# Altium footprint library SMD Component.PcbLib: 163 footprints (part 3 of 11)
Each footprint in its own frame and in the unit in brackets; x right, y up, seen from the top. Pads: shape width x height; smd on the part's side, far side on the other; paste and mask are expansions set on the pad; w line width, h text height; cw(c..) or ccw(c..) is an arc to the next point about the centre after c.
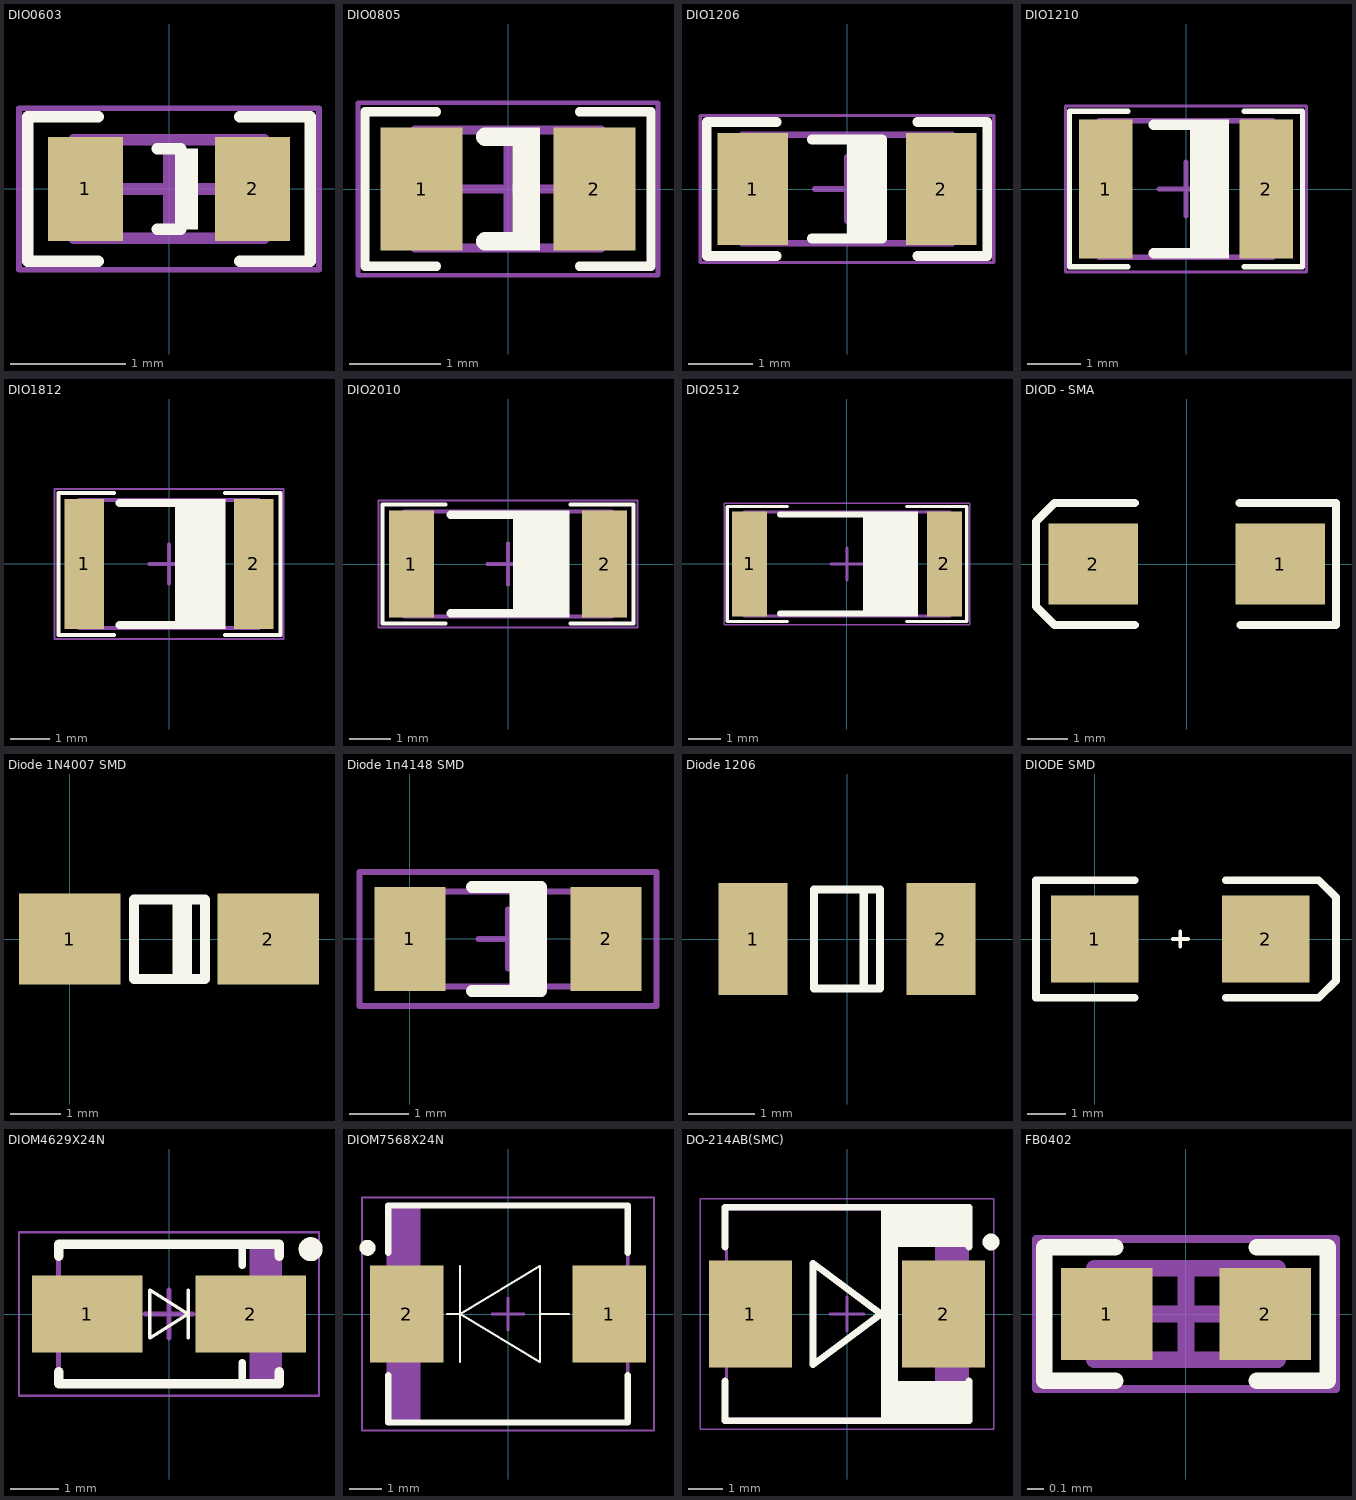
[diagram p2: the footprints below, top view; thin cyan lines are the x and y axes]

## DIO0603 [mm] "Chip Diode, 2-Leads, Body 1/60x0/80mm, IPC Medium Density DESIGNER:ABBAS BASEREH"
height 0.4
pads (2):
  rect 0.65x0.9 smd: 1(-0.725,0) 2(0.725,0)
Top Overlay:
  rectangle: 0.05,-0.35 0.25,0.35
  lines w0.1: -0.612,-0.625 -1.225,-0.625 -1.225,0.625 -0.612,0.625 ; -0.1,-0.35 0.1,-0.35 ; -0.1,0.35 0.1,0.35 ; 0.612,-0.625 1.225,-0.625 1.225,0.625 0.612,0.625
Mechanical 13:
  lines w0.1: -0.825,-0.425 -0.825,0.425 0.825,0.425 0.825,-0.425 -0.825,-0.425
Mechanical 15:
  lines w0.05: -1.3,-0.7 -1.3,0.7 1.3,0.7 1.3,-0.7 -1.3,-0.7
  lines w0.1: -0.425,0 0.425,0 ; 0,-0.425 0,0.425
3D body "DIO0603.step": height 0.4, standoff 0, extent -0.825,-0.425 0.825,0.425

## DIO0805 [mm] "Chip Diode, 2-Leads, Body 2/00x1/25mm, IPC Medium Density DESIGNER:ABBAS BASEREH"
height 0.5
pads (2):
  rect 0.9x1.35 smd: 1(-0.95,0) 2(0.95,0)
Top Overlay:
  rectangle: 0.05,-0.675 0.35,0.675
  lines w0.1: -0.788,-0.85 -1.575,-0.85 -1.575,0.85 -0.788,0.85 ; 0.788,-0.85 1.575,-0.85 1.575,0.85 0.788,0.85
  lines w0.2: -0.25,-0.575 0.1,-0.575 ; -0.25,0.575 0.1,0.575
Mechanical 13:
  lines w0.1: -1.025,-0.65 -1.025,0.65 1.025,0.65 1.025,-0.65 -1.025,-0.65
Mechanical 15:
  lines w0.05: -1.65,-0.95 -1.65,0.95 1.65,0.95 1.65,-0.95 -1.65,-0.95
  lines w0.1: -0.5,0 0.5,0 ; 0,-0.5 0,0.5
3D body "DIO0805.step": height 0.5, standoff 0, extent -1.025,-0.65 1.025,0.65

## DIO1206 [mm] "Chip Diode, 2-Leads, Body 3/20x1/60mm, IPC Medium Density DESIGNER:ABBAS BASEREH"
height 0.94
pads (2):
  rect 1.1x1.75 smd: 1(-1.475,0) 2(1.475,0)
Top Overlay:
  rectangle: 0,-0.8 0.625,0.775
  lines w0.15: -1.1,-1.05 -2.2,-1.05 -2.2,1.05 -1.1,1.05 ; -0.55,-0.775 0.55,-0.775 ; -0.55,0.775 0.55,0.775 ; 1.1,-1.05 2.2,-1.05 2.2,1.05 1.1,1.05
Mechanical 13:
  lines w0.1: -1.65,-0.85 1.65,-0.85 1.65,0.85 -1.65,0.85 -1.65,-0.85
Mechanical 15:
  lines w0.05: -2.3,-1.15 2.3,-1.15 2.3,1.15 -2.3,1.15 -2.3,-1.15
  lines w0.1: -0.5,0 0.5,0 ; 0,-0.5 0,0.5
3D body "DIO1206.step": height 0.94, standoff 0, extent -1.65,-0.85 1.65,0.85

## DIO1210 [mm] "Chip Diode, 2-Leads, Body 3/20x2/50mm, IPC Medium Density DESIGNER:ABBAS BASEREH"
height 0.55
pads (2):
  rect 1x2.6 smd: 1(-1.5,0) 2(1.5,0)
Top Overlay:
  rectangle: 0.075,-1.3 0.8,1.3
  lines w0.1: -1.088,-1.45 -2.175,-1.45 -2.175,1.45 -1.088,1.45 ; 1.088,-1.45 2.175,-1.45 2.175,1.45 1.088,1.45
  lines w0.2: -0.6,-1.2 0.6,-1.2 ; -0.6,1.2 0.6,1.2
Mechanical 13:
  lines w0.1: -1.625,-1.275 1.625,-1.275 1.625,1.275 -1.625,1.275 -1.625,-1.275
Mechanical 15:
  lines w0.05: -2.25,-1.55 2.25,-1.55 2.25,1.55 -2.25,1.55 -2.25,-1.55
  lines w0.1: -0.5,0 0.5,0 ; 0,-0.5 0,0.5
3D body "DIO1210.step": height 0.55, standoff 0, extent -1.625,-1.275 1.625,1.275

## DIO1812 [mm] "Chip Diode, 2-Leads, Body 4/50x3/20mm, IPC Medium Density DESIGNER:ABBAS BASEREH"
height 0.55
pads (2):
  rect 1x3.3 smd: 1(-2.15,0) 2(2.15,0)
Top Overlay:
  rectangle: 0.15,-1.65 1.425,1.65
  lines w0.1: -1.394,-1.8 -2.8,-1.8 -2.8,1.8 -1.394,1.8 ; 1.419,-1.8 2.825,-1.8 2.825,1.8 1.419,1.8
  lines w0.2: -1.25,-1.55 1.25,-1.55 ; -1.25,1.55 1.25,1.55
Mechanical 13:
  lines w0.1: -2.275,-1.625 -2.275,1.625 2.275,1.625 2.275,-1.625 -2.275,-1.625
Mechanical 15:
  lines w0.05: -2.9,-1.9 -2.9,1.9 2.9,1.9 2.9,-1.9 -2.9,-1.9
  lines w0.1: -0.5,0 0.5,0 ; 0,-0.5 0,0.5
3D body "DIO1812.step": height 0.55, standoff 0, extent -2.275,-1.625 2.275,1.625

## DIO2010 [mm] "Chip Diode, 2-Leads, Body 5/00x2/50mm, IPC Medium Density DESIGNER:ABBAS BASEREH"
height 0.55
pads (2):
  rect 1.1x2.6 smd: 1(-2.35,0) 2(2.35,0)
Top Overlay:
  rectangle: 0.125,-1.3 1.5,1.3
  lines w0.1: -1.525,-1.45 -3.05,-1.45 -3.05,1.45 -1.525,1.45 ; 1.525,-1.45 3.05,-1.45 3.05,1.45 1.525,1.45
  lines w0.2: -1.4,-1.2 1.4,-1.2 ; -1.4,1.2 1.4,1.2
Mechanical 13:
  lines w0.1: -2.525,-1.275 2.525,-1.275 2.525,1.275 -2.525,1.275 -2.525,-1.275
Mechanical 15:
  lines w0.05: -3.15,-1.55 3.15,-1.55 3.15,1.55 -3.15,1.55 -3.15,-1.55
  lines w0.1: -0.5,0 0.5,0 ; 0,-0.5 0,0.5
3D body "DIO2010.step": height 0.55, standoff 0, extent -2.525,-1.275 2.525,1.275

## DIO2512 [mm] "Chip Diode, 2-Leads, Body 6/40x3/20mm, IPC Medium Density DESIGNER:ABBAS BASEREH"
height 0.7
pads (2):
  rect 1.1x3.3 smd: 1(-3.05,0) 2(3.05,0)
Top Overlay:
  rectangle: 0.5,-1.65 2.225,1.65
  lines w0.1: -1.875,-1.8 -3.75,-1.8 -3.75,1.8 -1.875,1.8 ; 1.875,-1.8 3.75,-1.8 3.75,1.8 1.875,1.8
  lines w0.2: -2.1,-1.55 2.1,-1.55 ; -2.1,1.55 2.1,1.55
Mechanical 13:
  lines w0.1: -3.225,-1.625 3.225,-1.625 3.225,1.625 -3.225,1.625 -3.225,-1.625
Mechanical 15:
  lines w0.05: -3.85,-1.9 3.85,-1.9 3.85,1.9 -3.85,1.9 -3.85,-1.9
  lines w0.1: -0.5,0 0.5,0 ; 0,-0.5 0,0.5
3D body "DIO2512.step": height 0.7, standoff 0, extent -3.225,-1.625 3.225,1.625

## DIOD - SMA [mm]
pads (2):
  rect 2.2x2 smd: 1(2.3,0) 2(-2.3,0)
Top Overlay:
  lines w0.2: -1.275,-1.5 -3.25,-1.5 -3.706,-1.044 -3.706,1.044 -3.25,1.5 -1.275,1.501 ; 1.3,1.5 3.675,1.5 3.675,-1.5 1.325,-1.5

## Diode 1N4007 SMD [mm] "DO-214AC 1N4001-4007"
pads (2):
  rect 2x1.8 smd: 1(0,0) 2(3.92,0)
Top Overlay:
  rectangle: 2.032,-0.81 2.413,0.827
  lines w0.2: 1.27,-0.787 2.667,-0.787 2.667,0.78 1.27,0.78 1.27,-0.787
3D body "User Library-DO-214AC_SMA.step": height 2.16, standoff -0.04, extent -0.54,-1.36 4.46,1.34

## Diode 1n4148 SMD [mm] "Mini MELF SOD-80"
pads (2):
  rect 1.2x1.75 smd: 1(0,0) 2(3.3,0)
Top Overlay:
  region: 2.223,0.875 1.673,0.875 1.673,-0.875 2.223,-0.875
  lines w0.2: 1.04,-0.875 2.209,-0.875 2.209,0.875 1.04,0.875
Mechanical 13:
  rectangle: -0.2,-0.8 0.298,0.8
  lines w0.1: -0.2,-0.8 -0.2,0.8 3.5,0.8 3.5,-0.8 -0.2,-0.8
Mechanical 15:
  lines w0.1: 1.15,0 2.15,0 ; 1.65,-0.5 1.65,0.5 ; -0.85,-1.125 -0.85,1.125 4.15,1.125 4.15,-1.125 -0.85,-1.125
3D body "User Library-Diode MELF.STEP": height 1.55, standoff 0.05, extent -0.125,-0.75 3.375,0.75

## Diode 1206 [mm]
pads (2):
  rect 1.05x1.7 smd: 1(-1.425,0) 2(1.425,0)
Top Overlay:
  lines w0.127: 0.254,-0.75 0.254,0.75 ; -0.5,-0.75 0.5,-0.75 0.5,0.75 -0.5,0.75 -0.5,-0.75
3D body "User Library-D1206.step": height 0.85, standoff 0, extent -1.67,-0.87 1.68,0.86

## DIODE SMD [mm]
pads (2):
  rect 2.3x2.3 smd: 1(0,0) 2(4.5,0)
Top Overlay:
  lines w0.1: 2.05,0 2.45,0 ; 2.25,-0.2 2.25,0.2
  lines w0.2: 1.05,-1.55 -1.55,-1.55 -1.55,1.55 1.05,1.55 ; 3.45,-1.55 5.9,-1.55 6.35,-1.1 6.35,1.1 5.9,1.55 3.45,1.55
3D body "User Library-Diode Molded Body.STEP": height 2.31, standoff 0.02, extent -0.285,-1.321 4.815,1.279

## DIOM4629X24N [mm] "Molded Diode, 2-Leads, Body 4/60x2/90mm, IPC Medium Density-Design:Abbas Basereh"
height 2.43
pads (2):
  rect 2.3x1.6 smd: 1(-1.7,0) 2(1.7,0)
Top Overlay:
  circle w0.25: c2.95,1.35 r0.125
  lines w0.07: 0.4,-0.5 0.4,0.5 ; -0.4,-0.5 0.4,0 -0.4,0.5 -0.4,-0.5
  lines w0.15: 1.524,-1.45 1.524,-1.016 ; 1.524,1.016 1.524,1.397
  lines w0.2: -2.3,-1.2 -2.3,-1.45 2.3,-1.45 2.3,-1.2 ; -2.3,1.2 -2.3,1.45 2.3,1.45 2.3,1.2
Mechanical 13:
  rectangle: 1.681,-1.45 2.3,1.45
  lines w0.1: -2.3,-1.45 2.3,-1.45 2.3,1.45 -2.3,1.45 -2.3,-1.45
Mechanical 15:
  lines w0.05: -3.125,-1.7 3.125,-1.7 3.125,1.7 -3.125,1.7 -3.125,-1.7
  lines w0.1: -0.5,0 0.5,0 ; 0,-0.5 0,0.5
3D body "User Library-DO-214AC_SMA.STEP": height 2.2, standoff 0, extent -2.5,-1.223 2.5,1.477

## DIOM7568X24N [mm] "Molded Diode, 2-Leads, Body 7/50x6/80mm, IPC Medium Density-Design:Abbas Basereh"
height 2.4
pads (2):
  rect 2.3x3.05 smd: 1(3.175,0) 2(-3.175,0)
Top Overlay:
  circle w0.25: c-4.4,2.075 r0.125
  lines w0.07: -1.9,0 -1.5,0 ; -1.5,-1.5 -1.5,1.5 ; 1,0 1.9,0 ; -1.5,0 1,1.5 1,-1.5 -1.5,0
  lines w0.2: -3.75,-1.925 -3.75,-3.4 3.75,-3.4 3.75,-1.925 ; -3.75,1.925 -3.75,3.4 3.75,3.4 3.75,1.925
Mechanical 13:
  rectangle: -3.75,-3.4 -2.741,3.4
  lines w0.1: -3.75,-3.4 -3.75,3.4 3.75,3.4 3.75,-3.4 -3.75,-3.4
Mechanical 15:
  lines w0.05: -4.575,-3.65 -4.575,3.65 4.575,3.65 4.575,-3.65 -4.575,-3.65
  lines w0.1: -0.5,0 0.5,0 ; 0,-0.5 0,0.5
3D body "SW3DPS-SMC-DEFAULT.STEP": height 2.8, standoff 0, extent -3.808,-3.172 3.81,3.048

## DO-214AB(SMC) [mm] "Molded Diode, 2-Leads, Body 6/85x5/90mm, IPC Medium Density DESIGNER ABBAS BASEREH"
height 2.62
pads (2):
  rect 2.45x3.15 smd: 1(-2.85,0) 2(2.85,0)
Top Overlay:
  circle w0.25: c4.25,2.125 r0.125
  rectangle: 1,-2 1.5,1.975
  rectangle: 1,-3.2 3.6,-1.975
  rectangle: 1,1.975 3.6,3.15
  lines w0.2: -3.6,-1.975 -3.6,-3.15 3.6,-3.15 3.6,-1.975 ; -3.6,1.975 -3.6,3.15 3.6,3.15 3.6,1.975 ; -1,-1.5 1,0 -1,1.5 -1,-1.5
Mechanical 13:
  rectangle: 2.599,-3.11 3.555,3.11
  lines w0.1: -3.555,-3.11 3.555,-3.11 3.555,3.11 -3.555,3.11 -3.555,-3.11
Mechanical 15:
  lines w0.05: -4.325,-3.4 4.325,-3.4 4.325,3.4 -4.325,3.4 -4.325,-3.4
  lines w0.1: -0.5,0 0.5,0 ; 0,-0.5 0,0.5
3D body "DO-214AB(SMC).step": height 2.62, standoff 0, extent -3.775,-3.11 3.775,3.11

## FB0402 [mm] "Ferrite Chip Bead SMD 0402-Design:Ali Hafizi"
pads (2):
  rect 0.55x0.55 smd mask+0.06: 1(-0.475,0) 2(0.475,0)
Top Overlay:
  lines w0.1: -0.425,-0.4 -0.85,-0.4 -0.85,0.4 -0.425,0.4 ; 0.425,-0.4 0.85,-0.4 0.85,0.4 0.425,0.4
Mechanical 13:
  lines w0.1: -0.55,-0.275 -0.55,0.275 0.55,0.275 0.55,-0.275 -0.55,-0.275
Mechanical 15:
  lines w0.05: -0.9,-0.45 -0.9,0.45 0.9,0.45 0.9,-0.45 -0.9,-0.45
  lines w0.1: -0.275,0 0.275,0 ; 0,-0.275 0,0.275
3D body "User Library-FB_1005.STEP": height 0.5, standoff 0, extent -0.5,-0.25 0.5,0.25